# Altium footprint library Lib_001.PcbLib: 429 footprints (part 14 of 28)
Each footprint in its own frame and in the unit in brackets; x right, y up, seen from the top. Pads: shape width x height; smd on the part's side, far side on the other; paste and mask are expansions set on the pad; w line width, h text height; cw(c..) or ccw(c..) is an arc to the next point about the centre after c.
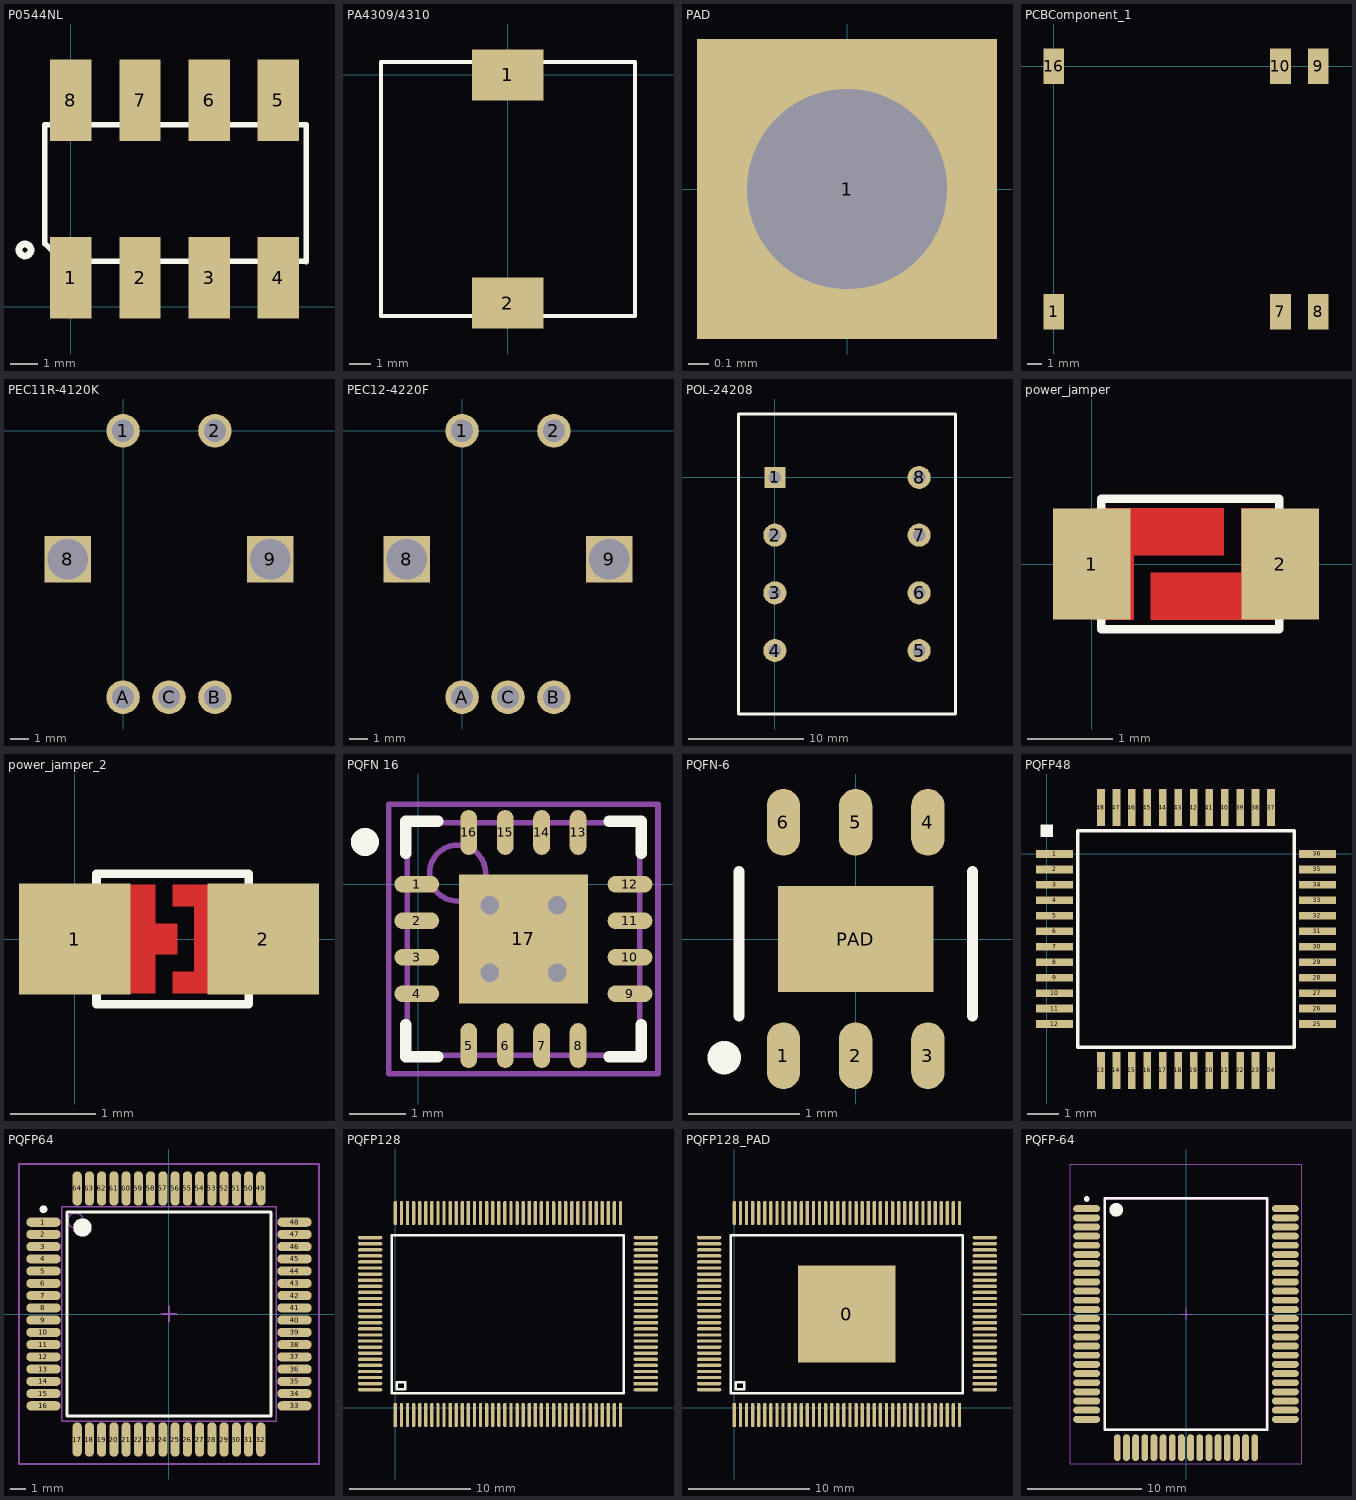
[diagram p13: the footprints below, top view; thin cyan lines are the x and y axes]

## P0544NL [mm] "SMT Gate Drive Transformers"
pads (8):
  rect 1.52x3 smd: 1(-0.004,1.066) 2(2.54,1.066) 3(5.08,1.066) 4(7.622,1.066) 5(7.619,7.585) 6(5.08,7.585) 7(2.54,7.585) 8(-0.004,7.585)
Top Overlay:
  circle w0.254: c-1.693,2.084 r0.219
  lines w0.2: -0.962,2.31 -0.962,6.684 8.66,6.684 8.66,1.654 ; -0.962,2.33 -0.306,1.674 8.66,1.674
3D body: height 7.62, standoff 0, extent -0.952,1.07 8.66,7.683
3D body: height 2, standoff 0, extent -0.748,0 0.748,3.212
3D body: height 2, standoff 0, extent 1.792,0 3.288,3.212
3D body: height 2, standoff 0, extent 4.332,0 5.828,3.212
3D body: height 2, standoff 0, extent 6.872,0 8.368,3.212
3D body: height 2, standoff 0, extent 6.87,5.471 8.366,8.683
3D body: height 2, standoff 0, extent 4.33,5.471 5.826,8.683
3D body: height 2, standoff 0, extent 1.79,5.471 3.286,8.683
3D body: height 2, standoff 0, extent -0.75,5.471 0.746,8.683

## PA4309/4310 [mm]
pads (2):
  rect 3.4x2.4 smd: 1(0,0) 2(0,-10.786)
Top Overlay:
  lines w0.2: -5.99,-11.393 0.01,-11.393 6.01,-11.393 6.01,-5.393 6.01,0.607 0.01,0.607 -5.99,0.607 -5.99,-5.393 -5.99,-11.393
3D body: height 8, standoff 0, extent -5.99,-11.393 6.01,0.607

## PAD [mm]
pads (1):
  rect 1.5x1.5 hole 1 unplated: 1(0,0)

## PCBComponent_1 [mm]
pads (6):
  rect 1.4x2.4 smd: 1(0,-16.5) 7(15.24,-16.5) 8(17.78,-16.5) 9(17.78,0) 10(15.24,0) 16(0,0)
3D body "55480.stp": height 8.2, standoff -0.25, extent -3.08,-17.32 20.92,0.78

## PEC11R-4120K [mm]
pads (7):
  round 1.824 hole 1.2: 1(0,0) 2(5,0) A(0,-14.5) B(5,-14.5) C(2.5,-14.5)
  rect 2.524x2.524 hole 2.2 square: 8(-3,-7) 9(8,-7)
3D body "pec11r-4115k-s0018.stp": height 21.6, standoff -3.6, extent -4.46,-14.748 9.54,0.152

## PEC12-4220F [mm]
pads (7):
  round 1.824 hole 1.2: 1(0,0) 2(5,0) A(0,-14.5) B(5,-14.5) C(2.5,-14.5)
  rect 2.524x2.524 hole 2.2 square: 8(-3,-7) 9(8,-7)
3D body "pec12r-4230f-n0024.stp": height 20, standoff -3.5, extent -4.6,-14.7 9.4,0.05

## POL-24208 [mm] "Трансформатор - Применение: TOP 226; Габарит: E25-верт."
pads (8):
  rect 1.8x1.8 hole 1.1: 1(0,0)
  round 2 hole 1.1: 2(0,-5) 3(0,-10) 4(0,-15) 5(12.5,-15) 6(12.5,-10) 7(12.5,-5) 8(12.5,0)
Top Overlay:
  lines w0.254: -3.15,-20.5 -3.15,5.5 0,5.5 15.65,5.5 15.65,-20.5 -3.14,-20.5
Mechanical 1:
  lines w0.254: 0,0 0.4,0
3D body "User Library-POL-24208.step": height 23.5, standoff -3, extent -3.21,-20.45 15.59,5.55

## power_jamper [mm]
pads (2):
  rect 0.9x1.3 smd mask+0: 1(0,0)
  rect 0.9x1.3 smd mask+0.102: 2(2.2,0)
Top Layer:
  region: 0.012,0.65 1.543,0.65 1.543,0.1 0.489,0.1 0.489,-0.65 0.012,-0.65
  region: 1.743,0.651 1.743,-0.1 0.689,-0.1 0.689,-0.649 2.139,-0.649 2.139,0.651
Top Overlay:
  lines w0.1: 0.112,-0.762 0.112,0.762 2.188,0.762 2.188,-0.762 0.112,-0.762
Top Solder:
  rectangle: 0.254,-0.65 2.037,0.651

## power_jamper_2 [mm]
pads (2):
  rect 1.3x1.3 smd mask+0.102: 1(0,0) 2(2.2,0)
Top Layer:
  region: 1.143,0.635 1.143,0.381 1.397,0.381 1.397,-0.381 1.143,-0.381 1.143,-0.635 1.651,-0.635 1.651,0.635
  region: 0.61,0.635 0.94,0.635 0.94,0.178 1.194,0.178 1.194,-0.178 0.94,-0.178 0.94,-0.635 0.61,-0.635
Top Overlay:
  lines w0.1: 0.254,-0.762 2.032,-0.762 2.032,0.762 0.254,0.762 0.254,-0.762
Top Solder:
  region: 0.61,0.635 0.94,0.635 0.94,0.178 1.194,0.178 1.194,-0.178 0.94,-0.178 0.94,-0.635 0.61,-0.635
  region: 1.143,0.635 1.143,0.381 1.397,0.381 1.397,-0.381 1.143,-0.381 1.143,-0.635 1.651,-0.635 1.651,0.635

## PQFN 16 [mm] "16-Pin Plastic Quad Flat No-Lead 0.65 mm Pitch, IPC High Density"
height 1
pads (17):
  oval 0.8x0.3 smd: 1(-0.02,0) 2(-0.02,-0.65) 3(-0.02,-1.3) 4(-0.02,-1.95) 9(3.78,-1.95) 10(3.78,-1.3) 11(3.78,-0.65) 12(3.78,0)
  oval 0.3x0.8 smd: 5(0.905,-2.875) 6(1.555,-2.875) 7(2.205,-2.875) 8(2.855,-2.875) 13(2.855,0.925) 14(2.205,0.925) 15(1.555,0.925) 16(0.905,0.925)
  rect 2.3x2.3 smd: 17(1.88,-0.975)
via 1.28,-0.375 diameter 0.66 hole 0.33
via 2.48,-0.375 diameter 0.66 hole 0.33
via 1.28,-1.575 diameter 0.66 hole 0.33
via 2.48,-1.575 diameter 0.66 hole 0.33
Top Overlay:
  circle w0.25: c-0.945,0.755 r0.125
  lines w0.2: -0.22,-2.5 -0.22,-3.075 0.355,-3.075 ; -0.22,0.55 -0.22,1.125 0.355,1.125 ; 3.405,-3.075 3.98,-3.075 3.98,-2.5 ; 3.405,1.125 3.98,1.125 3.98,0.55
Mechanical 13:
  circle w0.1: c0.705,0.2 r0.5
  lines w0.1: -0.195,-3.05 -0.195,1.1 3.955,1.1 3.955,-3.05 -0.195,-3.05
Mechanical 15:
  lines w0.1: 1.38,-0.975 2.38,-0.975 ; 1.88,-1.475 1.88,-0.475 ; -0.52,-3.375 -0.52,1.425 4.28,1.425 4.28,-3.375 -0.52,-3.375
3D body "User Library-QFN-16-1.STEP": height 0.85, standoff 0, extent -0.195,-3.065 3.975,1.105

## PQFN-6 [mm]
pads (7):
  oval 0.3x0.6 smd: 1(-0.65,-1.05) 2(0,-1.05) 3(0.65,-1.05) 4(0.65,1.05) 5(0,1.05) 6(-0.65,1.05)
  rect 1.4x0.95 smd: PAD(0,0)
Top Overlay:
  circle w0.254: c-1.183,-1.068 r0.023
  lines w0.1: -1.05,-0.694 -1.05,0.606 ; 1.05,-0.694 1.05,0.606
3D body "User Library-User Library-QFN6.step": height 0.75, standoff 0, extent -1,-1.001 1,1.001

## PQFP48 [mm] "TQFP 48 Leads with Exposed Pad"
height 1.2
pads (48):
  rect 1.2x0.25 smd: 1(0.25,0) 2(0.25,-0.5) 3(0.25,-1) 4(0.25,-1.5) 5(0.25,-2) 6(0.25,-2.5) 7(0.25,-3) 8(0.25,-3.5) 9(0.25,-4) 10(0.25,-4.5) 11(0.25,-5) 12(0.25,-5.5) 25(8.75,-5.5) 26(8.75,-5) 27(8.75,-4.5) 28(8.75,-4) 29(8.75,-3.5) 30(8.75,-3) 31(8.75,-2.5) 32(8.75,-2) 33(8.75,-1.5) 34(8.75,-1) 35(8.75,-0.5) 36(8.75,0)
  rect 0.25x1.2 smd: 13(1.75,-7) 14(2.25,-7) 15(2.75,-7) 16(3.25,-7) 17(3.75,-7) 18(4.25,-7) 19(4.75,-7) 20(5.25,-7) 21(5.75,-7) 22(6.25,-7) 23(6.75,-7) 24(7.25,-7) 37(7.25,1.5) 38(6.75,1.5) 39(6.25,1.5) 40(5.75,1.5) 41(5.25,1.5) 42(4.75,1.5) 43(4.25,1.5) 44(3.75,1.5) 45(3.25,1.5) 46(2.75,1.5) 47(2.25,1.5) 48(1.75,1.5)
Top Overlay:
  rectangle: -0.2,0.55 0.2,0.95
  lines w0.1: 1,-6.25 8,-6.25 8,0.75 1,0.75 1,-6.25
3D body "TQFP48_PAD.STEP": height 1.1, standoff 0, extent 0,-7.25 9,1.75

## PQFP64 [mm] "64-Pin Plastic Quad Flat Pack 0.8 mm Pitch, IPC Low Density"
height 3.4
pads (64):
  oval 2.25x0.6 smd: 1(-8.2,6) 2(-8.2,5.2) 3(-8.2,4.4) 4(-8.2,3.6) 5(-8.2,2.8) 6(-8.2,2) 7(-8.2,1.2) 8(-8.2,0.4) 9(-8.2,-0.4) 10(-8.2,-1.2) 11(-8.2,-2) 12(-8.2,-2.8) 13(-8.2,-3.6) 14(-8.2,-4.4) 15(-8.2,-5.2) 16(-8.2,-6) 33(8.2,-6) 34(8.2,-5.2) 35(8.2,-4.4) 36(8.2,-3.6) 37(8.2,-2.8) 38(8.2,-2) 39(8.2,-1.2) 40(8.2,-0.4) 41(8.2,0.4) 42(8.2,1.2) 43(8.2,2) 44(8.2,2.8) 45(8.2,3.6) 46(8.2,4.4) 47(8.2,5.2) 48(8.2,6)
  oval 0.6x2.25 smd: 17(-6,-8.2) 18(-5.2,-8.2) 19(-4.4,-8.2) 20(-3.6,-8.2) 21(-2.8,-8.2) 22(-2,-8.2) 23(-1.2,-8.2) 24(-0.4,-8.2) 25(0.4,-8.2) 26(1.2,-8.2) 27(2,-8.2) 28(2.8,-8.2) 29(3.6,-8.2) 30(4.4,-8.2) 31(5.2,-8.2) 32(6,-8.2) 49(6,8.2) 50(5.2,8.2) 51(4.4,8.2) 52(3.6,8.2) 53(2.8,8.2) 54(2,8.2) 55(1.2,8.2) 56(0.4,8.2) 57(-0.4,8.2) 58(-1.2,8.2) 59(-2,8.2) 60(-2.8,8.2) 61(-3.6,8.2) 62(-4.4,8.2) 63(-5.2,8.2) 64(-6,8.2)
Top Overlay:
  circle w0.6: c-5.65,5.65 r0.3
  circle w0.25: c-8.2,6.85 r0.125
  lines w0.2: -6.65,-6.65 6.65,-6.65 6.65,6.65 -6.65,6.65 -6.65,-6.65
Mechanical 13:
  circle w0.1: c-6.1,6.1 r0.5
  lines w0.1: -7,-7 7,-7 7,7 -7,7 -7,-7
Mechanical 15:
  lines w0.1: -0.5,0 0.5,0 ; 0,-0.5 0,0.5 ; -9.8,-9.8 9.8,-9.8 9.8,9.8 -9.8,9.8 -9.8,-9.8
3D body "User Library-TQFP 64 14x14mm 0_8mm pitch.step": height -0.4, standoff -1.9, extent -8,-8 8,8

## PQFP128 [mm]
pads (128):
  rect 0.279x2 smd: 1(0,-0.6) 10(4.503,-0.6) 20(9.507,-0.6) 70(16.012,16) 80(11.008,16) 90(6.005,16) 100(1.001,16)
  oval 0.279x2 smd: 2(0.5,-0.6) 3(1.001,-0.6) 4(1.501,-0.6) 5(2.002,-0.6) 6(2.502,-0.6) 7(3.002,-0.6) 8(3.503,-0.6) 9(4.003,-0.6) 11(5.004,-0.6) 12(5.504,-0.6) 13(6.005,-0.6) 14(6.505,-0.6) 15(7.005,-0.6) 16(7.506,-0.6) 17(8.006,-0.6) 18(8.506,-0.6) 19(9.007,-0.6) 21(10.008,-0.6) 22(10.508,-0.6) 23(11.008,-0.6) 24(11.509,-0.6) 25(12.009,-0.6) 26(12.509,-0.6) 27(13.01,-0.6) 28(13.51,-0.6) 29(14.011,-0.6) 30(14.511,-0.6) 31(15.011,-0.6) 32(15.512,-0.6) 33(16.012,-0.6) 34(16.513,-0.6) 35(17.013,-0.6) 36(17.513,-0.6) 37(18.014,-0.6) 38(18.514,-0.6) 65(18.514,16) 66(18.014,16) 67(17.513,16) 68(17.013,16) 69(16.513,16) 71(15.512,16) 72(15.011,16) 73(14.511,16) 74(14.011,16) 75(13.51,16) 76(13.01,16) 77(12.509,16) 78(12.009,16) 79(11.509,16) 81(10.508,16) 82(10.008,16) 83(9.507,16) 84(9.007,16) 85(8.506,16) 86(8.006,16) 87(7.506,16) 88(7.005,16) 89(6.505,16) 91(5.504,16) 92(5.004,16) 93(4.503,16) 94(4.003,16) 95(3.503,16) 96(3.002,16) 97(2.502,16) 98(2.002,16) 99(1.501,16) 101(0.5,16) 102(0,16)
  oval 2x0.279 smd: 39(20.6,1.473) 41(20.6,2.474) 42(20.6,2.974) 43(20.6,3.475) 44(20.6,3.975) 45(20.6,4.475) 46(20.6,4.976) 47(20.6,5.476) 48(20.6,5.977) 49(20.6,6.477) 51(20.6,7.478) 52(20.6,7.978) 53(20.6,8.479) 54(20.6,8.979) 55(20.6,9.479) 56(20.6,9.98) 57(20.6,10.48) 58(20.6,10.98) 59(20.6,11.481) 61(20.6,12.482) 62(20.6,12.982) 63(20.6,13.482) 64(20.6,13.983) 103(-2.074,13.983) 104(-2.074,13.482) 105(-2.074,12.982) 106(-2.074,12.482) 107(-2.074,11.981) 108(-2.074,11.481) 109(-2.074,10.98) 111(-2.074,9.98) 112(-2.074,9.479) 113(-2.074,8.979) 114(-2.074,8.479) 115(-2.074,7.978) 116(-2.074,7.478) 117(-2.074,6.977) 118(-2.074,6.477) 119(-2.074,5.977) 121(-2.074,4.976) 122(-2.074,4.475) 123(-2.074,3.975) 124(-2.074,3.475) 125(-2.074,2.974) 126(-2.074,2.474) 127(-2.074,1.974) 128(-2.074,1.473)
  rect 2x0.279 smd: 40(20.6,1.974) 50(20.6,6.977) 60(20.6,11.981) 110(-2.074,10.48) 120(-2.074,5.476)
Top Overlay:
  lines w0.2: -0.1,14.187 18.782,14.187 18.782,1.199 -0.3,1.199 -0.3,14.187 0.2,14.187 ; 0.1,1.499 0.1,2.098 0.799,2.098 0.799,1.499 0.1,1.499
3D body "SW3dPS-PQFP128.STEP": height 2.92, standoff 0.04, extent -2.37,-0.871 20.832,16.331

## PQFP128_PAD [mm]
pads (129):
  rect 8x8 smd: 0(9.241,7.693)
  rect 0.279x2 smd: 1(0,-0.6) 10(4.503,-0.6) 20(9.507,-0.6) 70(16.012,16) 80(11.008,16) 90(6.005,16) 100(1.001,16)
  oval 0.279x2 smd: 2(0.5,-0.6) 3(1.001,-0.6) 4(1.501,-0.6) 5(2.002,-0.6) 6(2.502,-0.6) 7(3.002,-0.6) 8(3.503,-0.6) 9(4.003,-0.6) 11(5.004,-0.6) 12(5.504,-0.6) 13(6.005,-0.6) 14(6.505,-0.6) 15(7.005,-0.6) 16(7.506,-0.6) 17(8.006,-0.6) 18(8.506,-0.6) 19(9.007,-0.6) 21(10.008,-0.6) 22(10.508,-0.6) 23(11.008,-0.6) 24(11.509,-0.6) 25(12.009,-0.6) 26(12.509,-0.6) 27(13.01,-0.6) 28(13.51,-0.6) 29(14.011,-0.6) 30(14.511,-0.6) 31(15.011,-0.6) 32(15.512,-0.6) 33(16.012,-0.6) 34(16.513,-0.6) 35(17.013,-0.6) 36(17.513,-0.6) 37(18.014,-0.6) 38(18.514,-0.6) 65(18.514,16) 66(18.014,16) 67(17.513,16) 68(17.013,16) 69(16.513,16) 71(15.512,16) 72(15.011,16) 73(14.511,16) 74(14.011,16) 75(13.51,16) 76(13.01,16) 77(12.509,16) 78(12.009,16) 79(11.509,16) 81(10.508,16) 82(10.008,16) 83(9.507,16) 84(9.007,16) 85(8.506,16) 86(8.006,16) 87(7.506,16) 88(7.005,16) 89(6.505,16) 91(5.504,16) 92(5.004,16) 93(4.503,16) 94(4.003,16) 95(3.503,16) 96(3.002,16) 97(2.502,16) 98(2.002,16) 99(1.501,16) 101(0.5,16) 102(0,16)
  oval 2x0.279 smd: 39(20.6,1.473) 41(20.6,2.474) 42(20.6,2.974) 43(20.6,3.475) 44(20.6,3.975) 45(20.6,4.475) 46(20.6,4.976) 47(20.6,5.476) 48(20.6,5.977) 49(20.6,6.477) 51(20.6,7.478) 52(20.6,7.978) 53(20.6,8.479) 54(20.6,8.979) 55(20.6,9.479) 56(20.6,9.98) 57(20.6,10.48) 58(20.6,10.98) 59(20.6,11.481) 61(20.6,12.482) 62(20.6,12.982) 63(20.6,13.482) 64(20.6,13.983) 103(-2.074,13.983) 104(-2.074,13.482) 105(-2.074,12.982) 106(-2.074,12.482) 107(-2.074,11.981) 108(-2.074,11.481) 109(-2.074,10.98) 111(-2.074,9.98) 112(-2.074,9.479) 113(-2.074,8.979) 114(-2.074,8.479) 115(-2.074,7.978) 116(-2.074,7.478) 117(-2.074,6.977) 118(-2.074,6.477) 119(-2.074,5.977) 121(-2.074,4.976) 122(-2.074,4.475) 123(-2.074,3.975) 124(-2.074,3.475) 125(-2.074,2.974) 126(-2.074,2.474) 127(-2.074,1.974) 128(-2.074,1.473)
  rect 2x0.279 smd: 40(20.6,1.974) 50(20.6,6.977) 60(20.6,11.981) 110(-2.074,10.48) 120(-2.074,5.476)
Top Overlay:
  lines w0.2: -0.1,14.187 18.782,14.187 18.782,1.199 -0.3,1.199 -0.3,14.187 0.2,14.187 ; 0.1,1.499 0.1,2.098 0.799,2.098 0.799,1.499 0.1,1.499
3D body "SW3dPS-PQFP128.STEP": height 2.92, standoff 0.04, extent -2.37,-0.871 20.832,16.331

## PQFP-64 [mm] "80-Pin Quad Flat Pack Rectangular 0.8 mm Pitch, IPC Medium Density"
height 2.3
pads (64):
  oval 2.35x0.6 smd: 1(-8.675,9.2) 2(-8.675,8.4) 3(-8.675,7.6) 4(-8.675,6.8) 5(-8.675,6) 6(-8.675,5.2) 7(-8.675,4.4) 8(-8.675,3.6) 9(-8.675,2.8) 10(-8.675,2) 11(-8.675,1.2) 12(-8.675,0.4) 13(-8.675,-0.4) 14(-8.675,-1.2) 15(-8.675,-2) 16(-8.675,-2.8) 17(-8.675,-3.6) 18(-8.675,-4.4) 19(-8.675,-5.2) 20(-8.675,-6) 21(-8.675,-6.8) 22(-8.675,-7.6) 23(-8.675,-8.4) 24(-8.675,-9.2) 41(8.675,-9.2) 42(8.675,-8.4) 43(8.675,-7.6) 44(8.675,-6.8) 45(8.675,-6) 46(8.675,-5.2) 47(8.675,-4.4) 48(8.675,-3.6) 49(8.675,-2.8) 50(8.675,-2) 51(8.675,-1.2) 52(8.675,-0.4) 53(8.675,0.4) 54(8.675,1.2) 55(8.675,2) 56(8.675,2.8) 57(8.675,3.6) 58(8.675,4.4) 59(8.675,5.2) 60(8.675,6) 61(8.675,6.8) 62(8.675,7.6) 63(8.675,8.4) 64(8.675,9.2)
  oval 0.6x2.35 smd: 25(-6,-11.675) 26(-5.2,-11.675) 27(-4.4,-11.675) 28(-3.6,-11.675) 29(-2.8,-11.675) 30(-2,-11.675) 31(-1.2,-11.675) 32(-0.4,-11.675) 33(0.4,-11.675) 34(1.2,-11.675) 35(2,-11.675) 36(2.8,-11.675) 37(3.6,-11.675) 38(4.4,-11.675) 39(5.2,-11.675) 40(6,-11.675)
Top Overlay:
  circle w0.25: c-8.675,10.05 r0.125
  circle w0.6: c-6.1,9.1 r0.3
  lines w0.2: -7.1,-10.1 -7.1,10.1 7.1,10.1 7.1,-10.1 -7.1,-10.1
Mechanical 13:
  circle w0.1: c-6.1,9.1 r0.5
  lines w0.1: -7,-10 -7,10 7,10 7,-10 -7,-10
Mechanical 15:
  lines w0.1: -0.5,0 0.5,0 ; 0,-0.5 0,0.5 ; -10.1,-13.1 -10.1,13.1 10.1,13.1 10.1,-13.1 -10.1,-13.1
3D body "3.step": height 1.85, standoff 0, extent -8.953,-11.933 8.953,9.445
3D body "1.step": height 3.4, standoff 0, extent -7,-10 7,10